# Altium footprint library Connectors.PcbLib: 408 footprints (part 10 of 26)
Each footprint in its own frame and in the unit in brackets; x right, y up, seen from the top. Pads: shape width x height; smd on the part's side, far side on the other; paste and mask are expansions set on the pad; w line width, h text height; cw(c..) or ccw(c..) is an arc to the next point about the centre after c.
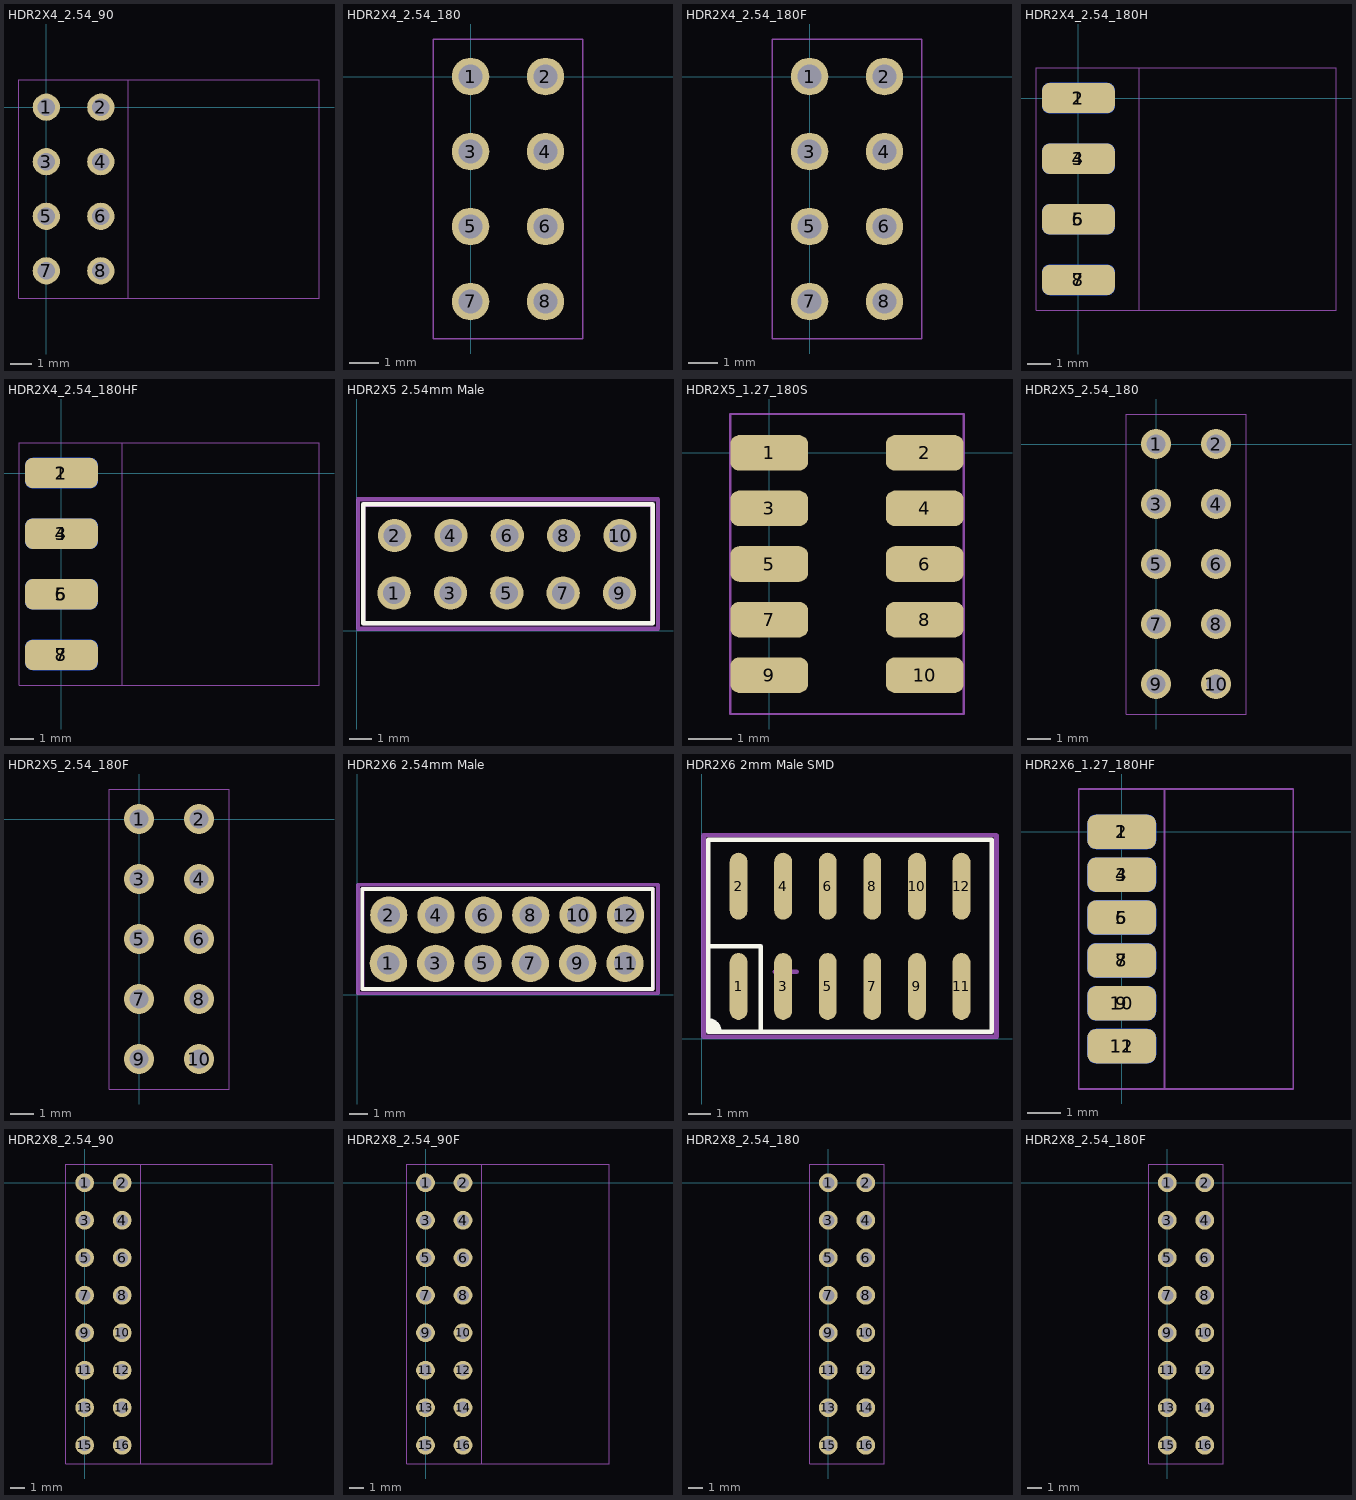
[diagram p9: the footprints below, top view; thin cyan lines are the x and y axes]

## HDR2X4_2.54_90 [mil]
height 169.29
pads (8):
  round 50 hole 32: 1(0,0) 2(100,0) 3(0,-100) 4(100,-100) 5(0,-200) 6(100,-200) 7(0,-300) 8(100,-300)
Mechanical 13:
  lines w2: -50,-350 -50,50 500,50 500,-350 -50,-350
Mechanical 14:
  lines w2: -50,-350 -50,50 150,50 150,-350 -50,-350
  text ".Designator" at 19,-170 h80
3D body "pin_header_awl254-da-g08d.stp": height 198.43, standoff -116.54, extent -12.44,-349.99 494.65,50.01

## HDR2X4_2.54_180 [mil]
height 169.29
pads (8):
  round 50 hole 32: 1(0,0) 2(100,0) 3(0,-100) 4(100,-100) 5(0,-200) 6(100,-200) 7(0,-300) 8(100,-300)
Mechanical 13:
  lines w2: -50,-350 -50,50 150,50 150,-350 -50,-350
Mechanical 14:
  lines w2: -50,-350 -50,50 150,50 150,-350 -50,-350
  text ".Designator" at 19,-170 h80
3D body "pin_header_awl254-dg-g08d.stp": height 334.65, standoff -118.11, extent -50,-349.99 150,50.01

## HDR2X4_2.54_180F [mil]
height 169.29
pads (8):
  round 50 hole 32: 1(0,0) 2(100,0) 3(0,-100) 4(100,-100) 5(0,-200) 6(100,-200) 7(0,-300) 8(100,-300)
Mechanical 13:
  lines w2: -50,-350 150,-350 150,50 -50,50 -50,-350
Mechanical 14:
  lines w2: -50,-350 150,-350 150,50 -50,50 -50,-350
  text ".Designator" at 19,-170 h80
3D body "female_header_a-bl254-dg-g08d.stp": height 334.65, standoff -125.98, extent -48.42,-354.92 148.43,54.93

## HDR2X4_2.54_180H [mil]
height 169.29
pads (8):
  rrect50% 120x50 smd: 1(0,0) 3(0,-100) 5(0,-200) 7(0,-300)
  rrect50% 120x50 smd far side: 2(0,0) 4(0,-100) 6(0,-200) 8(0,-300)
Mechanical 13:
  lines w2: -70,-350 425,-350 425,50 -70,50 -70,-350
Mechanical 14:
  lines w2: -70,-350 100,-350 100,50 -70,50 -70,-350
  text ".Designator" at -31,-170 h80
Mechanical 15:
  lines w2: -70,-350 100,-350 100,50 -70,50 -70,-350
3D body "pin_header_awl254-dg-g08d.stp": height 78, standoff -122, extent -38.11,-350 414.64,50

## HDR2X4_2.54_180HF [mil]
height 169.29
pads (8):
  rrect50% 120x50 smd: 1(0,0) 3(0,-100) 5(0,-200) 7(0,-300)
  rrect50% 120x50 smd far side: 2(0,0) 4(0,-100) 6(0,-200) 8(0,-300)
Mechanical 13:
  lines w2: -70,-350 425,-350 425,50 -70,50 -70,-350
Mechanical 14:
  lines w2: -70,-350 100,-350 100,50 -70,50 -70,-350
  text ".Designator" at -31,-170 h80
Mechanical 15:
  lines w2: -70,-350 100,-350 100,50 -70,50 -70,-350
3D body "female_header_a-bl254-dg-g08d.stp": height 76.43, standoff -120.43, extent -35.98,-354.92 424.65,54.92

## HDR2X5 2.54mm Male [mm]
pads (10):
  round 1.5 hole 1: 1(1.674,1.693) 2(1.697,4.282) 3(4.212,1.693) 4(4.235,4.282) 5(6.749,1.693) 6(6.772,4.282) 7(9.287,1.693) 8(9.31,4.278) 9(11.825,1.693) 10(11.848,4.278)
Top Overlay:
  lines w0.2: 0.282,0.324 13.317,0.324 13.317,5.681 0.282,5.681 0.282,0.324
Mechanical 13:
  lines w0.2: 0.29,0.332 0.29,5.675 13.305,5.675 13.305,0.332 0.29,0.332
Mechanical 15:
  lines w0.2: 3.706,1.693 4.722,1.693 ; 4.214,1.185 4.214,2.201 ; 0.048,0.091 0.048,5.908 13.557,5.908 13.557,0.091 0.048,0.091
3D body "User Library-samtec_TSW-105-07-T-D.STEP": height 8.48, standoff -2.44, extent 0.425,0.475 13.125,5.555

## HDR2X5_1.27_180S [mil]
height 169.29
pads (10):
  rrect50% 70x32 smd: 1(0,0) 2(140,0) 3(0,-50) 4(140,-50) 5(0,-100) 6(140,-100) 7(0,-150) 8(140,-150) 9(0,-200) 10(140,-200)
Mechanical 13:
  lines w2: -35,-235 175,-235 175,35 -35,35 -35,-235
Mechanical 14:
  lines w2: -35,-235 175,-235 175,35 -35,35 -35,-235
  text ".Designator" at 44,-120 h80
3D body "pin_header_a-sl127-dg-g10mp1.stp": height 252.13, standoff 0.25, extent -38.36,-224.99 178.34,25.01

## HDR2X5_2.54_180 [mil]
height 169.29
pads (10):
  round 50 hole 32: 1(0,0) 2(100,0) 3(0,-100) 4(100,-100) 5(0,-200) 6(100,-200) 7(0,-300) 8(100,-300) 9(0,-400) 10(100,-400)
Mechanical 13:
  lines w2: -50,-450 150,-450 150,50 -50,50 -50,-450
Mechanical 14:
  lines w2: -50,-450 -50,50 150,50 150,-450 -50,-450
  text ".Designator" at 19,-220 h80
3D body "pin_header_awl254-dg-g10d.stp": height 334.65, standoff -118.11, extent -50,-450 150,50

## HDR2X5_2.54_180F [mil]
height 169.29
pads (10):
  round 50 hole 32: 1(0,0) 2(100,0) 3(0,-100) 4(100,-100) 5(0,-200) 6(100,-200) 7(0,-300) 8(100,-300) 9(0,-400) 10(100,-400)
Mechanical 13:
  lines w2: -50,-450 -50,50 150,50 150,-450 -50,-450
Mechanical 14:
  lines w2: -50,-450 -50,50 150,50 150,-450 -50,-450
  text ".Designator" at 19,-220 h80
3D body "female_header_a-bl254-dg-g10d.stp": height 334.65, standoff -125.98, extent -48.43,-454.92 148.42,54.92

## HDR2X6 2.54mm Male [mm]
pads (12):
  round 2 hole 1.2: 1(1.674,1.693) 2(1.697,4.282) 3(4.212,1.693) 4(4.235,4.282) 5(6.749,1.693) 6(6.772,4.282) 7(9.287,1.693) 8(9.31,4.278) 9(11.825,1.693) 10(11.848,4.278) 11(14.364,1.693) 12(14.387,4.278)
Top Overlay:
  lines w0.2: 0.282,0.324 0.282,5.681 15.855,5.681 15.855,0.324 0.282,0.324
Mechanical 13:
  lines w0.2: 0.29,0.332 15.869,0.332 15.869,5.675 0.29,5.675 0.29,0.332
Mechanical 15:
  lines w0.2: 3.706,1.693 4.722,1.693 ; 4.214,1.185 4.214,2.201 ; 0.048,0.091 16.133,0.091 16.133,5.908 0.048,5.908 0.048,0.091
3D body "User Library-samtec_TSW-105-07-T-D.STEP": height 8.48, standoff -2.44, extent 2.991,0.471 15.691,5.551
3D body "User Library-samtec_TSW-105-07-T-D.STEP": height 8.48, standoff -2.44, extent 0.425,0.475 13.125,5.555

## HDR2X6 2mm Male SMD [mm]
pads (12):
  oval 0.8x3 smd: 1(1.658,2.341) 2(1.658,6.841) 3(3.658,2.341) 4(3.658,6.841) 5(5.658,2.341) 6(5.658,6.841) 7(7.658,2.341) 8(7.658,6.841) 9(9.658,2.341) 10(9.658,6.841) 11(11.658,2.341) 12(11.658,6.841)
Top Overlay:
  region: 0.242,0.301 0.242,0.781 0.492,0.781 0.782,0.491 0.782,0.301
  lines w0.2: 0.292,0.821 cw(c0.292,0.321) 0.792,0.321 ; 0.292,4.138 2.657,4.138 2.657,0.371 ; 0.332,0.641 0.362,0.641 cw(c0.362,0.301) 0.702,0.301 ; 0.292,0.301 0.292,8.928 13.026,8.928 13.026,0.301 0.292,0.301
Mechanical 13:
  lines w0.2: 0.104,0.082 13.253,0.082 13.253,9.114 0.104,9.114 0.104,0.082
Mechanical 15:
  lines w0.2: 3.272,3.001 4.272,3.001 ; 3.772,2.501 3.772,3.501 ; 0.082,0.082 0.082,9.12 13.212,9.12 13.212,0.082 0.082,0.082
3D body "User Library-pin_header_a-sl200-dg-g12mp1.STEP": height 6.5, standoff 0, extent 0.693,1.342 12.643,7.842

## HDR2X6_1.27_180HF [mil]
height 169.29
pads (12):
  rrect50% 80x40 smd: 1(0,0) 3(0,-50) 5(0,-100) 7(0,-150) 9(0,-200) 11(0,-250)
  rrect50% 80x40 smd far side: 2(0,0) 4(0,-50) 6(0,-100) 8(0,-150) 10(0,-200) 12(0,-250)
Mechanical 13:
  lines w2: -50,-300 -50,50 200,50 200,-300 -50,-300
Mechanical 14:
  lines w2: -50,-300 -50,50 50,50 50,-300 -50,-300
  text ".Designator" at -31,-145 h80
3D body "female_header_a-bl127-dg-g12d.stp": height 39.02, standoff -83.02, extent -28.35,-282.88 200,32.88

## HDR2X8_2.54_90 [mil]
height 169.29
pads (16):
  round 50 hole 32: 1(0,0) 2(100,0) 3(0,-100) 4(100,-100) 5(0,-200) 6(100,-200) 7(0,-300) 8(100,-300) 9(0,-400) 10(100,-400) 11(0,-500) 12(100,-500) 13(0,-600) 14(100,-600) 15(0,-700) 16(100,-700)
Mechanical 13:
  lines w2: -50,-750 500,-750 500,50 -50,50 -50,-750
Mechanical 14:
  lines w2: -50,-750 150,-750 150,50 -50,50 -50,-750
  text ".Designator" at 19,-370 h80
3D body "pin_header_awl254-da-g16d.stp": height 198.43, standoff -116.54, extent -10,-750 497.09,50

## HDR2X8_2.54_90F [mil]
height 169.29
pads (16):
  round 50 hole 32: 1(0,0) 2(100,0) 3(0,-100) 4(100,-100) 5(0,-200) 6(100,-200) 7(0,-300) 8(100,-300) 9(0,-400) 10(100,-400) 11(0,-500) 12(100,-500) 13(0,-600) 14(100,-600) 15(0,-700) 16(100,-700)
Mechanical 13:
  lines w2: -50,-750 -50,50 490,50 490,-750 -50,-750
Mechanical 14:
  lines w2: -50,-750 -50,50 150,50 150,-750 -50,-750
  text ".Designator" at 19,-370 h80
3D body "female_header_a-bl254-da-g16d.stp": height 198.43, standoff -124.41, extent -10,-754.92 486.06,54.92

## HDR2X8_2.54_180 [mil]
height 169.29
pads (16):
  round 50 hole 32: 1(0,0) 2(100,0) 3(0,-100) 4(100,-100) 5(0,-200) 6(100,-200) 7(0,-300) 8(100,-300) 9(0,-400) 10(100,-400) 11(0,-500) 12(100,-500) 13(0,-600) 14(100,-600) 15(0,-700) 16(100,-700)
Mechanical 13:
  lines w2: -50,-750 -50,50 150,50 150,-750 -50,-750
Mechanical 14:
  lines w2: -50,-750 -50,50 150,50 150,-750 -50,-750
  text ".Designator" at 19,-370 h80
3D body "pin_header_awl254-dg-g16d.stp": height 334.65, standoff -118.11, extent -50,-749.99 150,50.01

## HDR2X8_2.54_180F [mil]
height 169.29
pads (16):
  round 50 hole 32: 1(0,0) 2(100,0) 3(0,-100) 4(100,-100) 5(0,-200) 6(100,-200) 7(0,-300) 8(100,-300) 9(0,-400) 10(100,-400) 11(0,-500) 12(100,-500) 13(0,-600) 14(100,-600) 15(0,-700) 16(100,-700)
Mechanical 13:
  lines w2: -50,-750 -50,50 150,50 150,-750 -50,-750
Mechanical 14:
  lines w2: -50,-750 -50,50 150,50 150,-750 -50,-750
  text ".Designator" at 19,-370 h80
3D body "female_header_a-bl254-dg-g16d.stp": height 334.65, standoff -125.98, extent -48.42,-754.92 148.43,54.93